# Altium footprint library ESKDPcbLib.PcbLib: 608 footprints (part 17 of 38)
Each footprint in its own frame and in the unit in brackets; x right, y up, seen from the top. Pads: shape width x height; smd on the part's side, far side on the other; paste and mask are expansions set on the pad; w line width, h text height; cw(c..) or ccw(c..) is an arc to the next point about the centre after c.
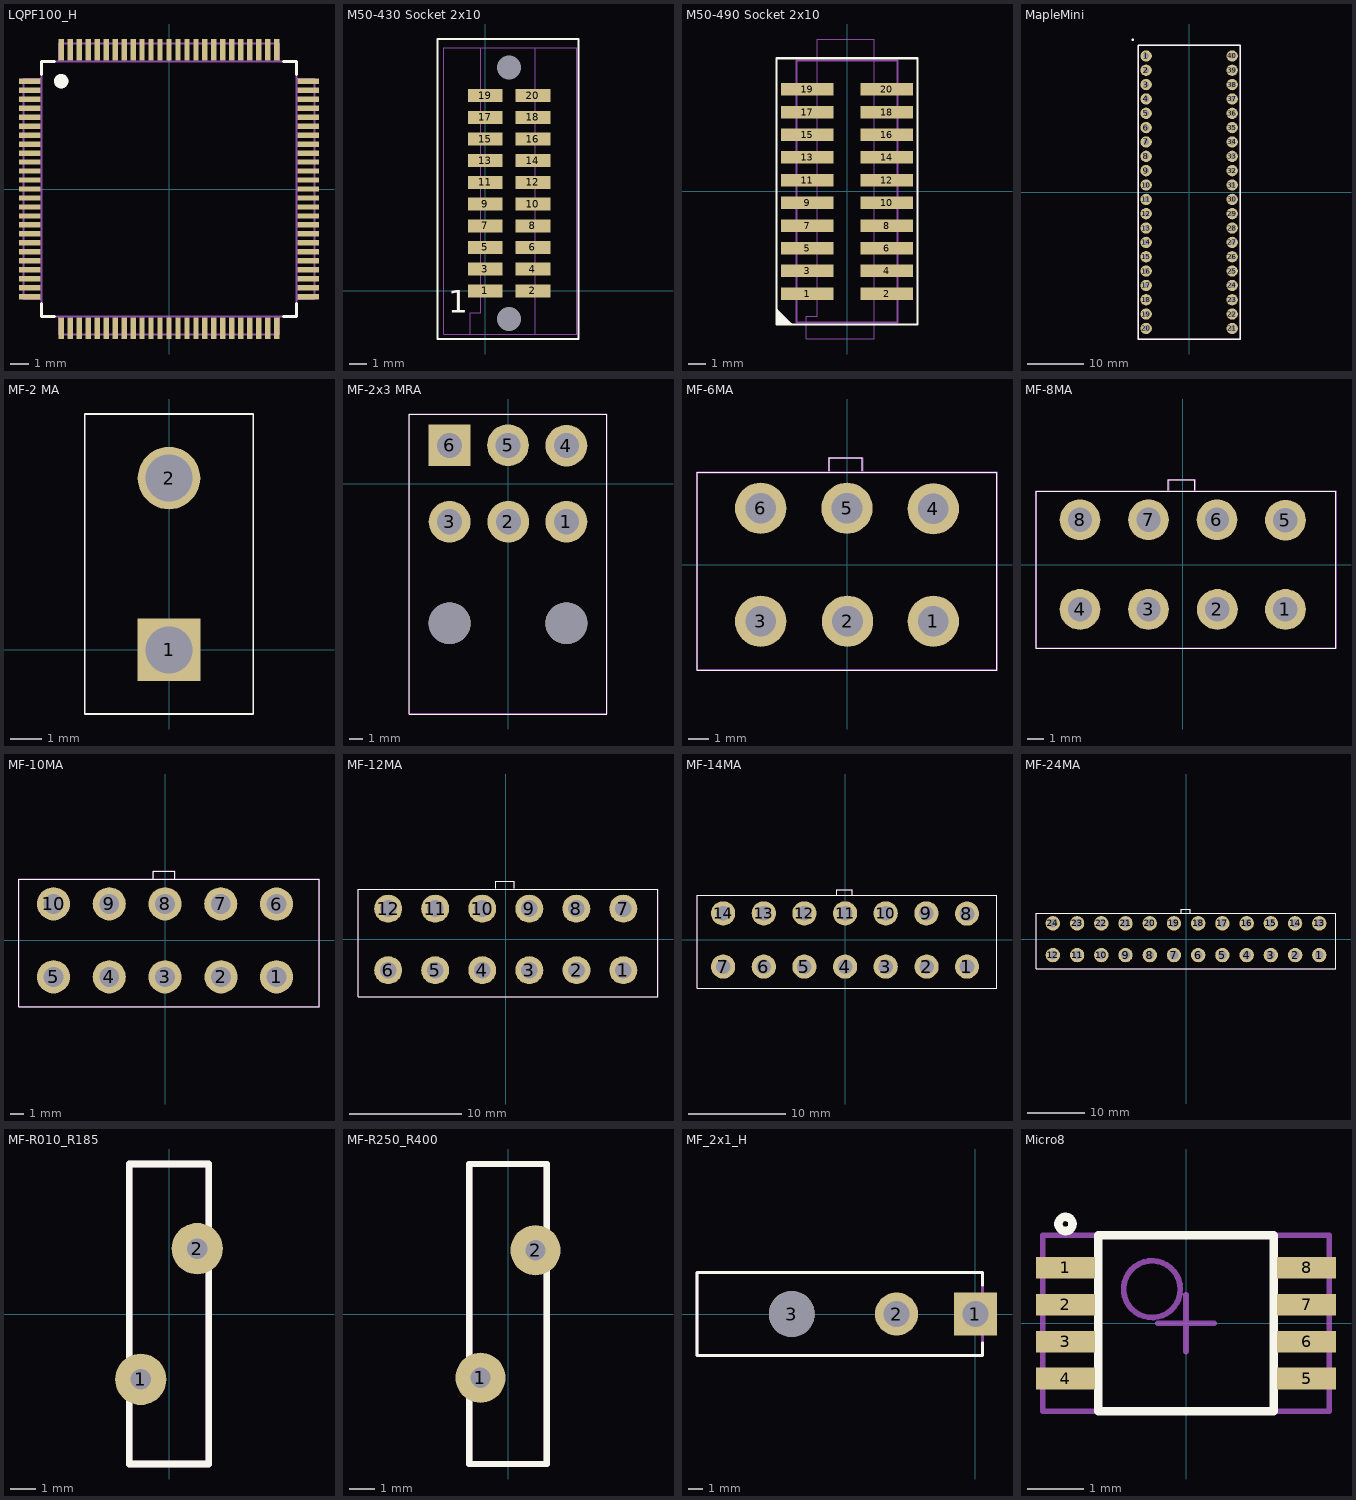
[diagram p16: the footprints below, top view; thin cyan lines are the x and y axes]

## LQPF100_H [mm]
height 1.6
pads (100):
  rect 1.2x0.3 smd: 1(-7.75,6) 2(-7.75,5.5) 3(-7.75,5) 4(-7.75,4.5) 5(-7.75,4) 6(-7.75,3.5) 7(-7.75,3) 8(-7.75,2.5) 9(-7.75,2) 10(-7.75,1.5) 11(-7.75,1) 12(-7.75,0.5) 13(-7.75,0) 14(-7.75,-0.5) 15(-7.75,-1) 16(-7.75,-1.5) 17(-7.75,-2) 18(-7.75,-2.5) 19(-7.75,-3) 20(-7.75,-3.5) 21(-7.75,-4) 22(-7.75,-4.5) 23(-7.75,-5) 24(-7.75,-5.5) 25(-7.75,-6) 51(7.75,-6) 52(7.75,-5.5) 53(7.75,-5) 54(7.75,-4.5) 55(7.75,-4) 56(7.75,-3.5) 57(7.75,-3) 58(7.75,-2.5) 59(7.75,-2) 60(7.75,-1.5) 61(7.75,-1) 62(7.75,-0.5) 63(7.75,0) 64(7.75,0.5) 65(7.75,1) 66(7.75,1.5) 67(7.75,2) 68(7.75,2.5) 69(7.75,3) 70(7.75,3.5) 71(7.75,4) 72(7.75,4.5) 73(7.75,5) 74(7.75,5.5) 75(7.75,6)
  rect 0.3x1.2 smd: 26(-6,-7.75) 27(-5.5,-7.75) 28(-5,-7.75) 29(-4.5,-7.75) 30(-4,-7.75) 31(-3.5,-7.75) 32(-3,-7.75) 33(-2.5,-7.75) 34(-2,-7.75) 35(-1.5,-7.75) 36(-1,-7.75) 37(-0.5,-7.75) 38(0,-7.75) 39(0.5,-7.75) 40(1,-7.75) 41(1.5,-7.75) 42(2,-7.75) 43(2.5,-7.75) 44(3,-7.75) 45(3.5,-7.75) 46(4,-7.75) 47(4.5,-7.75) 48(5,-7.75) 49(5.5,-7.75) 50(6,-7.75) 76(6,7.75) 77(5.5,7.75) 78(5,7.75) 79(4.5,7.75) 80(4,7.75) 81(3.5,7.75) 82(3,7.75) 83(2.5,7.75) 84(2,7.75) 85(1.5,7.75) 86(1,7.75) 87(0.5,7.75) 88(0,7.75) 89(-0.5,7.75) 90(-1,7.75) 91(-1.5,7.75) 92(-2,7.75) 93(-2.5,7.75) 94(-3,7.75) 95(-3.5,7.75) 96(-4,7.75) 97(-4.5,7.75) 98(-5,7.75) 99(-5.5,7.75) 100(-6,7.75)
Top Overlay:
  circle w0.4: c-6,6 r0.2
  lines w0.15: -7.1,-6.375 -7.1,-7.1 -6.375,-7.1 ; -7.1,6.375 -7.1,7.1 -6.375,7.1 ; 6.375,-7.1 7.1,-7.1 7.1,-6.375 ; 6.375,7.1 7.1,7.1 7.1,6.375
Mechanical 7:
  circle w0.4: c-6,6 r0.2
  lines w0.1: -7.1,-6.135 -8.1,-6.135 -8.1,6.135 -7.1,6.135 ; -6.135,-7.1 -6.135,-8.1 6.135,-8.1 6.135,-7.1 ; -6.135,7.1 -6.135,8.1 6.135,8.1 6.135,7.1 ; 7.1,-6.135 8.1,-6.135 8.1,6.135 7.1,6.135 ; -7.1,-7.1 -7.1,7.1 7.1,7.1 7.1,-7.1 -7.1,-7.1
Mechanical 10:
  text ".Comment" at -1.08,-0.495 h0.6
  text ".Designator" at -1.2,0.155 h0.8
3D body: height 1.6, standoff 0, extent -7.1,-7.1 7.1,7.1
3D body: height 0.9, standoff 0, extent -6.135,7.1 6.135,8.1
3D body: height 0.9, standoff 0, extent -8.1,-6.135 -7.1,6.135
3D body: height 0.9, standoff 0, extent 7.1,-6.135 8.1,6.135
3D body: height 0.9, standoff 0, extent -6.135,-8.1 6.135,-7.1

## M50-430 Socket 2x10 [mil]
height 240.16
pads (22):
  rect 80x30 smd paste-2 mask+4: 1(0,0) 2(110,0) 3(0,50) 4(110,50) 5(0,100) 6(110,100) 7(0,150) 8(110,150) 9(0,200) 10(110,200) 11(0,250) 12(110,250) 13(0,300) 14(110,300) 15(0,350) 16(110,350) 17(0,400) 18(110,400) 19(0,450) 20(110,450)
  round 5 / inner round 0 / far side round 5 hole 55 paste+0 mask+55: 21(55,-65) 22(54.96,515)
Top Overlay:
  lines w5: -110,-111 -110,580.51 215,580.51 215,-111 -110,-111
  text "1" at -85,-50 h52.5
Mechanical 1:
  lines w2: -35,-100 115,-100 115,560.83 -10,560.83 -10,-50 -35,-50 -35,-100
Mechanical 2:
  lines w0.1: -95.5,-100 -95.5,560.83 210.5,560.83 210.5,-100 -95.5,-100

## M50-490 Socket 2x10 [mm]
height 6.1
pads (20):
  rect 2.95x0.7 smd paste-0.051 mask+0.102: 1(-2.222,-5.715) 2(2.222,-5.715) 3(-2.222,-4.445) 4(2.222,-4.445) 5(-2.222,-3.175) 6(2.222,-3.175) 7(-2.222,-1.905) 8(2.222,-1.905) 9(-2.222,-0.635) 10(2.222,-0.635) 11(-2.222,0.635) 12(2.222,0.635) 13(-2.222,1.905) 14(2.222,1.905) 15(-2.222,3.175) 16(2.222,3.175) 17(-2.222,4.445) 18(2.222,4.445) 19(-2.222,5.715) 20(2.222,5.715)
Top Overlay:
  lines w0.127: -3.95,-7.237 -3.744,-7.444 ; -3.95,7.425 -3.95,-7.45 3.95,-7.45 3.95,7.425 ; -3.95,7.45 3.95,7.45 ; -3.937,-7.087 -3.612,-7.412 ; -3.937,-6.937 -3.437,-7.437 ; -3.937,-6.762 -3.3,-7.4 ; -3.937,-6.612 -3.119,-7.431
Mechanical 1:
  lines w0.051: -2.286,-8.255 -2.286,-6.985 -1.651,-6.985 -1.651,8.53 1.524,8.53 1.524,-8.255 -2.286,-8.255
Mechanical 7:
  lines w0.1: -2.825,-7.325 -2.825,7.325 2.825,7.325 2.825,-7.325 -2.825,-7.325
Mechanical 9:
  lines w0.1: -2.825,-7.325 2.825,-7.325 2.825,7.325 -2.825,7.325 -2.825,-7.325

## MapleMini [mm]
pads (40):
  round 2 hole 1: 1(-7.62,24.13) 2(-7.62,21.59) 3(-7.62,19.05) 4(-7.62,16.51) 5(-7.62,13.97) 6(-7.62,11.43) 7(-7.62,8.89) 8(-7.62,6.35) 9(-7.62,3.81) 10(-7.62,1.27) 11(-7.62,-1.27) 12(-7.62,-3.81) 13(-7.62,-6.35) 14(-7.62,-8.89) 15(-7.62,-11.43) 16(-7.62,-13.97) 17(-7.62,-16.51) 18(-7.62,-19.05) 19(-7.62,-21.59) 20(-7.62,-24.13) 21(7.62,-24.13) 22(7.62,-21.59) 23(7.62,-19.05) 24(7.62,-16.51) 25(7.62,-13.97) 26(7.62,-11.43) 27(7.62,-8.89) 28(7.62,-6.35) 29(7.62,-3.81) 30(7.62,-1.27) 31(7.62,1.27) 32(7.62,3.81) 33(7.62,6.35) 34(7.62,8.89) 35(7.62,11.43) 36(7.62,13.97) 37(7.62,16.51) 38(7.62,19.05) 39(7.62,21.59) 40(7.62,24.13)
Top Overlay:
  circle w0.254: c-10,27 r0.125
  lines w0.254: -9,-26 9,-26 9,26 -9,26 -9,-26
Mechanical 7:
  circle w0.254: c-10,27 r0.127
  lines w0.254: -9,-26 9,-26 9,26 -9,26 -9,-26
Mechanical 10:
  text ".Designator" at 3.875,27.35 h1
  text ".Comment" at 3.875,26.35 h1
3D body: height 2.3, standoff 0, extent 6.604,-25.4 8.636,25.4
3D body: height 2.3, standoff 0, extent -8.636,-25.4 -6.604,25.4
3D body: height 6, standoff 2.3, extent -9,-26 9,26

## MF-2 MA [mm]
pads (2):
  rect 2x2 hole 1.5: 1(0,0)
  round 2 hole 1.5: 2(0,5.5)
Top Overlay:
  lines w0.05: -2.7,-2.05 2.7,-2.05 2.7,7.55 -2.7,7.55 -2.7,-2.05
3D body: height 12.8, standoff -3, extent -2.7,-3.45 2.7,7.55

## MF-2x3 MRA [mm]
pads (8):
  round 3 hole 1.8: 1(4.2,-2.75) 2(0.025,-2.75) 3(-4.2,-2.75) 4(4.2,2.725) 5(0,2.75)
  rect 3x3 hole 1.8: 6(-4.2,2.75)
  round 3 hole 3 unplated: ""(-4.2,-10.05) ""(4.2,-10.05)
Top Overlay:
  lines w0.05: -7.1,-16.575 -7.1,5 7.1,5 7.1,-16.575 -7.1,-16.575
Mechanical 7:
  lines w0.1: -7.1,-16.568 -7.1,5 7.1,5 7.1,-16.568 -7.1,-16.568
Mechanical 10:
  text ".Designator" at 8.3,0.5 h1.52
  text ".Comment" at 9.1,1.9 h1.52
3D body: height 11.4, standoff -3.6, extent -7.1,-16.567 7.1,3.368

## MF-6MA [mm]
pads (6):
  round 2.5 hole 1.5: 1(4.2,-2.75) 2(0.025,-2.75) 3(-4.2,-2.75) 4(4.2,2.725) 5(0,2.75) 6(-4.2,2.75)
Top Overlay:
  lines w0.05: -0.875,4.575 -0.875,5.2 0.75,5.2 0.75,4.575 ; -7.3,-5.125 7.3,-5.125 7.3,4.5 -7.3,4.5 -7.3,-5.125
Mechanical 7:
  lines w0.1: -0.875,4.575 -0.875,5.2 0.75,5.2 0.75,4.575 ; -7.3,-5.125 7.3,-5.125 7.3,4.5 -7.3,4.5 -7.3,-5.125
Mechanical 10:
  text ".Comment" at -3.975,8 h1.52
  text ".Designator" at -5,7 h1.52
3D body "MF-6MA.stp": height 12.8, standoff -3.5, extent -7.3,-5.125 7.3,5.875

## MF-8MA [mm]
pads (8):
  round 2.5 hole 1.5: 1(6.3,-2.75) 2(2.125,-2.75) 3(-2.1,-2.75) 4(-6.3,-2.75) 5(6.3,2.725) 6(2.1,2.75) 7(-2.1,2.75) 8(-6.3,2.75)
Top Overlay:
  lines w0.05: -0.875,4.575 -0.875,5.2 0.75,5.2 0.75,4.575 ; -9,-5.125 9.4,-5.125 9.4,4.5 -9,4.5 -9,-5.125
Mechanical 7:
  lines w0.1: -0.875,4.575 -0.875,5.2 0.75,5.2 0.75,4.575 ; -9,-5.125 9.4,-5.125 9.4,4.5 -9,4.5 -9,-5.125
Mechanical 10:
  text ".Comment" at -3.975,8 h1.52
  text ".Designator" at -5,7 h1.52
3D body "MF-2x4S.stp": height 12.8, standoff -3.5, extent -9,-5.175 9.4,5.925

## MF-10MA [mm]
pads (10):
  round 2.5 hole 1.5: 1(8.4,-2.75) 2(4.225,-2.75) 3(0,-2.75) 4(-4.2,-2.75) 5(-8.4,-2.75) 6(8.4,2.725) 7(4.2,2.75) 8(0,2.75) 9(-4.2,2.75) 10(-8.4,2.75)
Top Overlay:
  lines w0.05: -0.875,4.575 -0.875,5.2 0.75,5.2 0.75,4.575 ; -11,-5 11.6,-5 11.6,4.6 -11,4.6 -11,-5
Mechanical 7:
  lines w0.1: -0.875,4.575 -0.875,5.2 0.75,5.2 0.75,4.575 ; -11,-5 11.6,-5 11.6,4.6 -11,4.6 -11,-5
Mechanical 10:
  text ".Comment" at -3.975,8 h1.52
  text ".Designator" at -5,7 h1.52
3D body "MF-2x5S.stp": height 12.8, standoff -3.5, extent -10.9,-4.95 11.7,6.15

## MF-12MA [mm]
pads (12):
  round 2.5 hole 1.5: 1(10.5,-2.75) 2(6.325,-2.75) 3(2.1,-2.75) 4(-2.1,-2.75) 5(-6.3,-2.75) 6(-10.5,-2.75) 7(10.5,2.75) 8(6.3,2.75) 9(2.1,2.75) 10(-2.1,2.75) 11(-6.3,2.75) 12(-10.5,2.75)
Top Overlay:
  lines w0.05: -0.875,4.575 -0.875,5.2 0.75,5.2 0.75,4.575 ; -13.2,-5.125 13.6,-5.125 13.6,4.5 -13.2,4.5 -13.2,-5.125
Mechanical 7:
  lines w0.1: -0.875,4.575 -0.875,5.2 0.75,5.2 0.75,4.575 ; -13.2,-5.125 13.6,-5.125 13.6,4.5 -13.2,4.5 -13.2,-5.125
Mechanical 10:
  text ".Comment" at -3.975,8 h1.52
  text ".Designator" at -5,7 h1.52
3D body "MF-2x6S.stp": height 12.8, standoff -3.5, extent -13.2,-5.1 13.6,6

## MF-14MA [mm]
pads (14):
  round 2.5 hole 1.5: 1(12.6,-2.75) 2(8.425,-2.75) 3(4.2,-2.75) 4(0,-2.75) 5(-4.2,-2.75) 6(-8.4,-2.75) 7(-12.6,-2.75) 8(12.6,2.725) 9(8.4,2.75) 10(4.2,2.75) 11(0,2.75) 12(-4.2,2.75) 13(-8.4,2.75) 14(-12.6,2.75)
Top Overlay:
  lines w0.05: -0.875,4.575 -0.875,5.2 0.75,5.2 0.75,4.575 ; -15.3,-5 15.7,-5 15.7,4.6 -15.3,4.6 -15.3,-5
Mechanical 7:
  lines w0.1: -0.875,4.575 -0.875,5.2 0.75,5.2 0.75,4.575 ; -15.3,-5 15.7,-5 15.7,4.6 -15.3,4.6 -15.3,-5
Mechanical 10:
  text ".Comment" at -3.975,8 h1.52
  text ".Designator" at -5,7 h1.52
3D body "MF-2x7S.stp": height 12.8, standoff -3.5, extent -15.325,-4.925 15.675,6.175

## MF-24MA [mm]
pads (24):
  round 2.5 hole 1.5: 1(23.1,-2.75) 2(18.925,-2.75) 3(14.7,-2.75) 4(10.5,-2.75) 5(6.3,-2.75) 6(2.1,-2.75) 7(-2.1,-2.75) 8(-6.275,-2.75) 9(-10.5,-2.75) 10(-14.7,-2.75) 11(-18.9,-2.75) 12(-23.1,-2.75) 13(23.1,2.75) 14(18.9,2.75) 15(14.7,2.75) 16(10.5,2.75) 17(6.3,2.75) 18(2.1,2.75) 19(-2.1,2.75) 20(-6.3,2.75) 21(-10.5,2.75) 22(-14.7,2.75) 23(-18.9,2.75) 24(-23.1,2.75)
Top Overlay:
  lines w0.05: -0.875,4.575 -0.875,5.2 0.75,5.2 0.75,4.575 ; -26.025,-5.125 25.975,-5.125 25.975,4.5 -26.025,4.5 -26.025,-5.125
Mechanical 7:
  lines w0.1: -0.875,4.575 -0.875,5.2 0.75,5.2 0.75,4.575 ; -26.025,-5.125 26,-5.125 26,4.5 -26.025,4.5 -26.025,-5.125
Mechanical 10:
  text ".Comment" at -3.975,8 h1.52
  text ".Designator" at -5,7 h1.52
3D body "MF-2x12S.stp": height 12.8, standoff -3.5, extent -26,-5.1 26,6

## MF-R010_R185 [mm]
pads (2):
  round 2 hole 0.8: 1(-1.1,-2.55) 2(1.1,2.55)
Top Overlay:
  lines w0.254: -1.55,-5.85 1.55,-5.85 1.55,5.85 -1.55,5.85 -1.55,-5.85
Mechanical 7:
  lines w0.254: -1.55,-5.85 1.55,-5.85 1.55,5.85 -1.55,5.85 -1.55,-5.85
Mechanical 10:
  text ".Comment" at 3.7,4 h1.52
  text ".Designator" at 2.675,3 h1.52
3D body "MF-R010_R185.STEP": height 17.05, standoff -2.65, extent -1.55,-5.85 1.55,5.85

## MF-R250_R400 [mm]
pads (2):
  round 2 hole 0.8: 1(-1.1,-2.55) 2(1.1,2.55)
Top Overlay:
  lines w0.254: -1.55,-6 -1.55,6 1.55,6 1.55,-6 -1.55,-6
Mechanical 7:
  lines w0.254: -1.55,-6 -1.55,6 1.55,6 1.55,-6 -1.55,-6
Mechanical 10:
  text ".Designator" at 2.675,3 h1.52
  text ".Comment" at 3.7,4 h1.52
3D body "MF-R250_R400.STEP": height 18.3, standoff -7.6, extent -1.41,-6 1.41,6

## MF_2x1_H [mm]
pads (3):
  rect 3x3 hole 1.8 mask+0: 1(0,0)
  round 3 hole 1.8 mask+0: 2(-5.5,0)
  round 3.2 hole 3.2 mask+0: 3(-12.8,0)
Top Overlay:
  lines w0.2: 0.5,-2 0.5,-2.9 -19.4,-2.9 -19.4,2.9 0.5,2.9 0.5,2
Mechanical 7:
  lines w0.2: -19.4,-2.9 -19.4,2.9 0.5,2.9 0.5,-2.9 -19.4,-2.9
Mechanical 10:
  text ".Comment" at -2,-3.6 h0.6
  text ".Designator" at -2.67,3.04 h0.8
3D body: height 11.4, standoff -3.6, extent -19.435,-2.9 0.5,2.9

## Micro8 [mm] "TSOP, 8-Leads, Body 3,1x3,1mm (max), Pitch 0,65mm, IPC Medium Density"
height 1.1
pads (8):
  rect 1.04x0.38 smd: 1(-2.125,0.975) 2(-2.125,0.325) 3(-2.125,-0.325) 4(-2.125,-0.975) 5(2.125,-0.975) 6(2.125,-0.325) 7(2.125,0.325) 8(2.125,0.975)
Top Overlay:
  circle w0.15: c-2.125,1.75 r0.125
  lines w0.15: -1.55,-1.55 -1.55,1.55 1.55,1.55 1.55,-1.55 -1.55,-1.55
Mechanical 7:
  circle w0.1: c-0.6,0.6 r0.5
  lines w0.1: -0.5,0 0.5,0 ; 0,-0.5 0,0.5 ; -1.55,-1.55 -2.525,-1.55 -2.525,1.55 -1.55,1.55 ; -1.55,-1.55 -1.55,1.55 ; -1.55,-1.55 1.55,-1.55 ; -1.55,1.55 1.55,1.55 ; 1.55,-1.55 2.525,-1.55 2.525,1.55 1.55,1.55 ; 1.55,-1.55 1.55,1.55
Mechanical 10:
  text ".Comment" at -1.425,-2.575 h1
  text ".Designator" at -1.925,2.575 h1
3D body: height 1.1, standoff 0.05, extent -1.55,-1.55 1.55,1.55